# Altium schematic symbol library LATTICEPLDS_Library.SchLib: 291 symbols (part 9 of 32) (continued)
## LFE2-70-F900 (continued)
part G pins: AA10 PB7B, AA12 VCCIO5 (power), AA13 VCCIO5 (power), AA14 VCCIO5 (power), AB10 PB7A, AB12 VCCIO5 (power), AB13 VCCIO5 (power), AB14 VCCIO5 (power), AB15 PB47A, AC8 PB2A, AC9 PB5A, AC10 PB9A, AC11 PB30A, AC12 PB35A, AC13 PB39B, AC14 PB42B, AD8 PB3A, AD9 PB6A, AD10 PB29A, AD11 PB30B, AD12 PB36A, AD13 PB40B, AD14 PB42A, AD15 PB47B, AD16 PB52A, AE8 PB2B, AE9 PB5B, AE10 PB9B, AE11 PB32A, AE12 PB35B, AE13 PB39A, AE14 PB43B, AE15 PB48A, AF6 PB11A, AF7 PB11B, AF8 PB3B, AF9 PB6B, AF10 PB29B, AF11 PB34A, AF12 PB36B, AF13 PB40A, AF14 PB45B, AF15 PB48B, AF16 PB52B, AG5 PB12A, AG6 PB13A, AG7 PB4A, AG9 PB31A, AG10 PB32B, AG11 PB38A, AG12 PB43A, AG14 PB49B, AG15 PB49A, AH5 PB12B, AH6 PB13B, AH7 PB4B, AH9 PB31B, AH10 PB34B, AH11 PB38B, AH12 PB45A, AH14 PB50B, AH15 PB50A, AJ4 PB14A, AJ5 PB15A, AJ6 PB16A, AJ7 PB8A, AJ8 PB10A, AJ9 PB33A, AJ10 PB37A, AJ11 PB41A, AJ12 PB44A, AJ13 PB46A, AJ14 PB51A, AJ15 PB53A, AK4 PB14B, AK5 PB15B, AK6 PB16B, AK7 PB8B, AK8 PB10B, AK9 PB33B, AK10 PB37B, AK11 PB41B, AK12 PB44B, AK13 PB46B, AK14 PB51B, AK15 PB53B
part H pins: AA1 PL80B, AA2 PL80A, AA3 PL82B, AA4 PL82A, AA5 PL81B, AA6 PL79A, AA7 PL81A, AA8 PL79B, AB1 PL84B, AB2 PL84A, AB3 PL86B, AB4 PL86A, AB5 PL83B, AB6 PL85B, AB7 PL83A, AB8 PL85A, AB9 PL91B, AC1 PL88B, AC2 PL88A, AC5 PL87B, AC6 PL89A, AC7 PL87A, AD1 PL90A, AD2 PL90B, AD6 PL89B, AD7 PL91A, R3 PL59B, R4 PL59A, T1 PL63B, T2 PL63A, T3 PL61A, T4 PL61B, T5 PL60A, T6 PL62A, T7 PL60B, T8 PL62B, U1 PL67B, U2 PL67A, U3 PL65B, U4 PL65A, U5 PL64B, U6 PL66B, U7 PL64A, U8 PL66A, U9 VCCIO6 (power), U10 VCCIO6 (power), V1 PL69B, V2 PL69A, V5 PL68B, V6 PL70B, V7 PL68A, V8 PL70A, V10 VCCIO6 (power), W1 PL71A, W2 PL71B, W3 PL73B, W4 PL73A, W5 PL72A, W6 PL74A, W7 PL72B, W8 PL74B, W9 VCCIO6 (power), W10 VCCIO6 (power), Y1 PL76A, Y2 PL76B, Y3 PL78B, Y4 PL78A, Y5 PL77A, Y6 PL77B, Y8 LLM0_PLLCAP, Y9 VCCIO6 (power)
part I pins: D1 PL4B, D2 PL4A, E1 PL5B, E2 PL5A, F1 PL14A, F2 PL14B, F3 PL2B, F4 PL2A, G1 PL15A, G2 PL15B, G3 PL19B, G4 PL19A, G5 PL3B, H1 PL21B, H2 PL21A, H4 PL3A, H5 PL20B, H6 PL18B, H7 PL20A, H8 PL18A, J1 PL23B, J2 PL23A, J3 PL25B, J4 PL25A, J5 PL24A, J6 PL22A, J7 PL24B, J8 PL22B, K1 PL27B, K2 PL27A, K3 PL29B, K4 PL29A, K5 PL28A, K6 PL26A, K7 PL28B, K8 PL26B, L1 PL31B, L2 PL31A, L3 PL33B, L4 PL33A, L5 PL32B, L6 PL30B, L7 PL32A, L8 PL30A, L9 VCCIO7 (power), L10 VCCIO7 (power), M1 PL35B, M2 PL35A, M3 PL37B, M4 PL37A, M5 PL36B, M6 PL34B, M7 PL36A, M8 PL34A, M10 VCCIO7 (power), N1 PL52B, N2 PL52A, N5 PL39A, N6 PL38A, N7 PL39B, N8 PL38B, N10 VCCIO7 (power), P1 PL56B, P2 PL56A, P3 PL54B, P4 PL54A, P5 PL53B, P6 PL53A, P7 PL51B, P10 VCCIO7 (power), R5 PL57A, R6 PL55A, R7 PL57B, R8 PL55B, R9 PL51A, R10 VCCIO7 (power), T9 PL50A
part J pins: AA21 VCCIO8 (power), AA22 PROGRAMN, AB22 CFG1, AB23 PR87A, AB24 PR87B, AB25 PR86B, AB26 PR86A, AB27 PR85A, AC24 DONE, AC25 PR90B, AC26 PR89B, AC27 PR85B, AD25 CCLK, AD26 INITN, AD27 PR88B, AD28 PR88A, AD29 PR84B, AD30 PR84A, AE25 CFG2, AE26 CFG0, AE27 PR90A, AE28 PR89A, Y21 VCCIO8 (power)
part K pins: AA9 TDO, AD3 VCCJ (power), AD4 TMS, AD5 TCK, AE7 TDI
part B text: BANK 0
part C text: BANK 1
part D text: BANK 2
part E text: BANK 3
part F text: BANK 4
part G text: BANK 5
part H text: BANK 6
part I text: BANK 7
part J text: BANK 8
part K text: JTAG

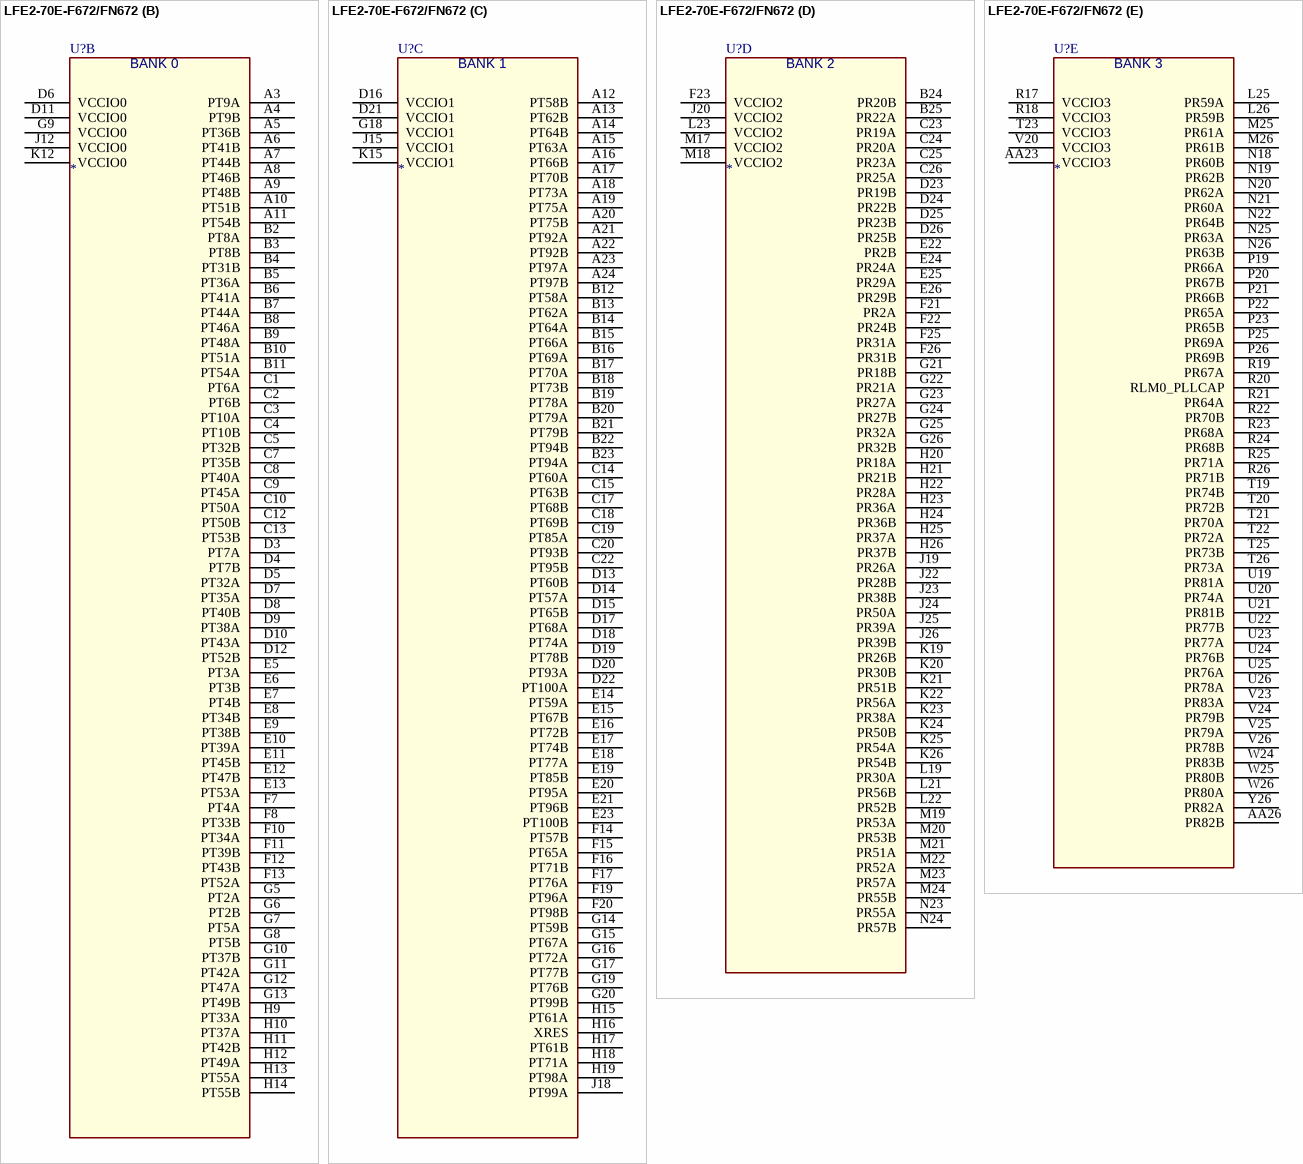
[diagram p93: symbol LFE2-70E-F672/FN672]

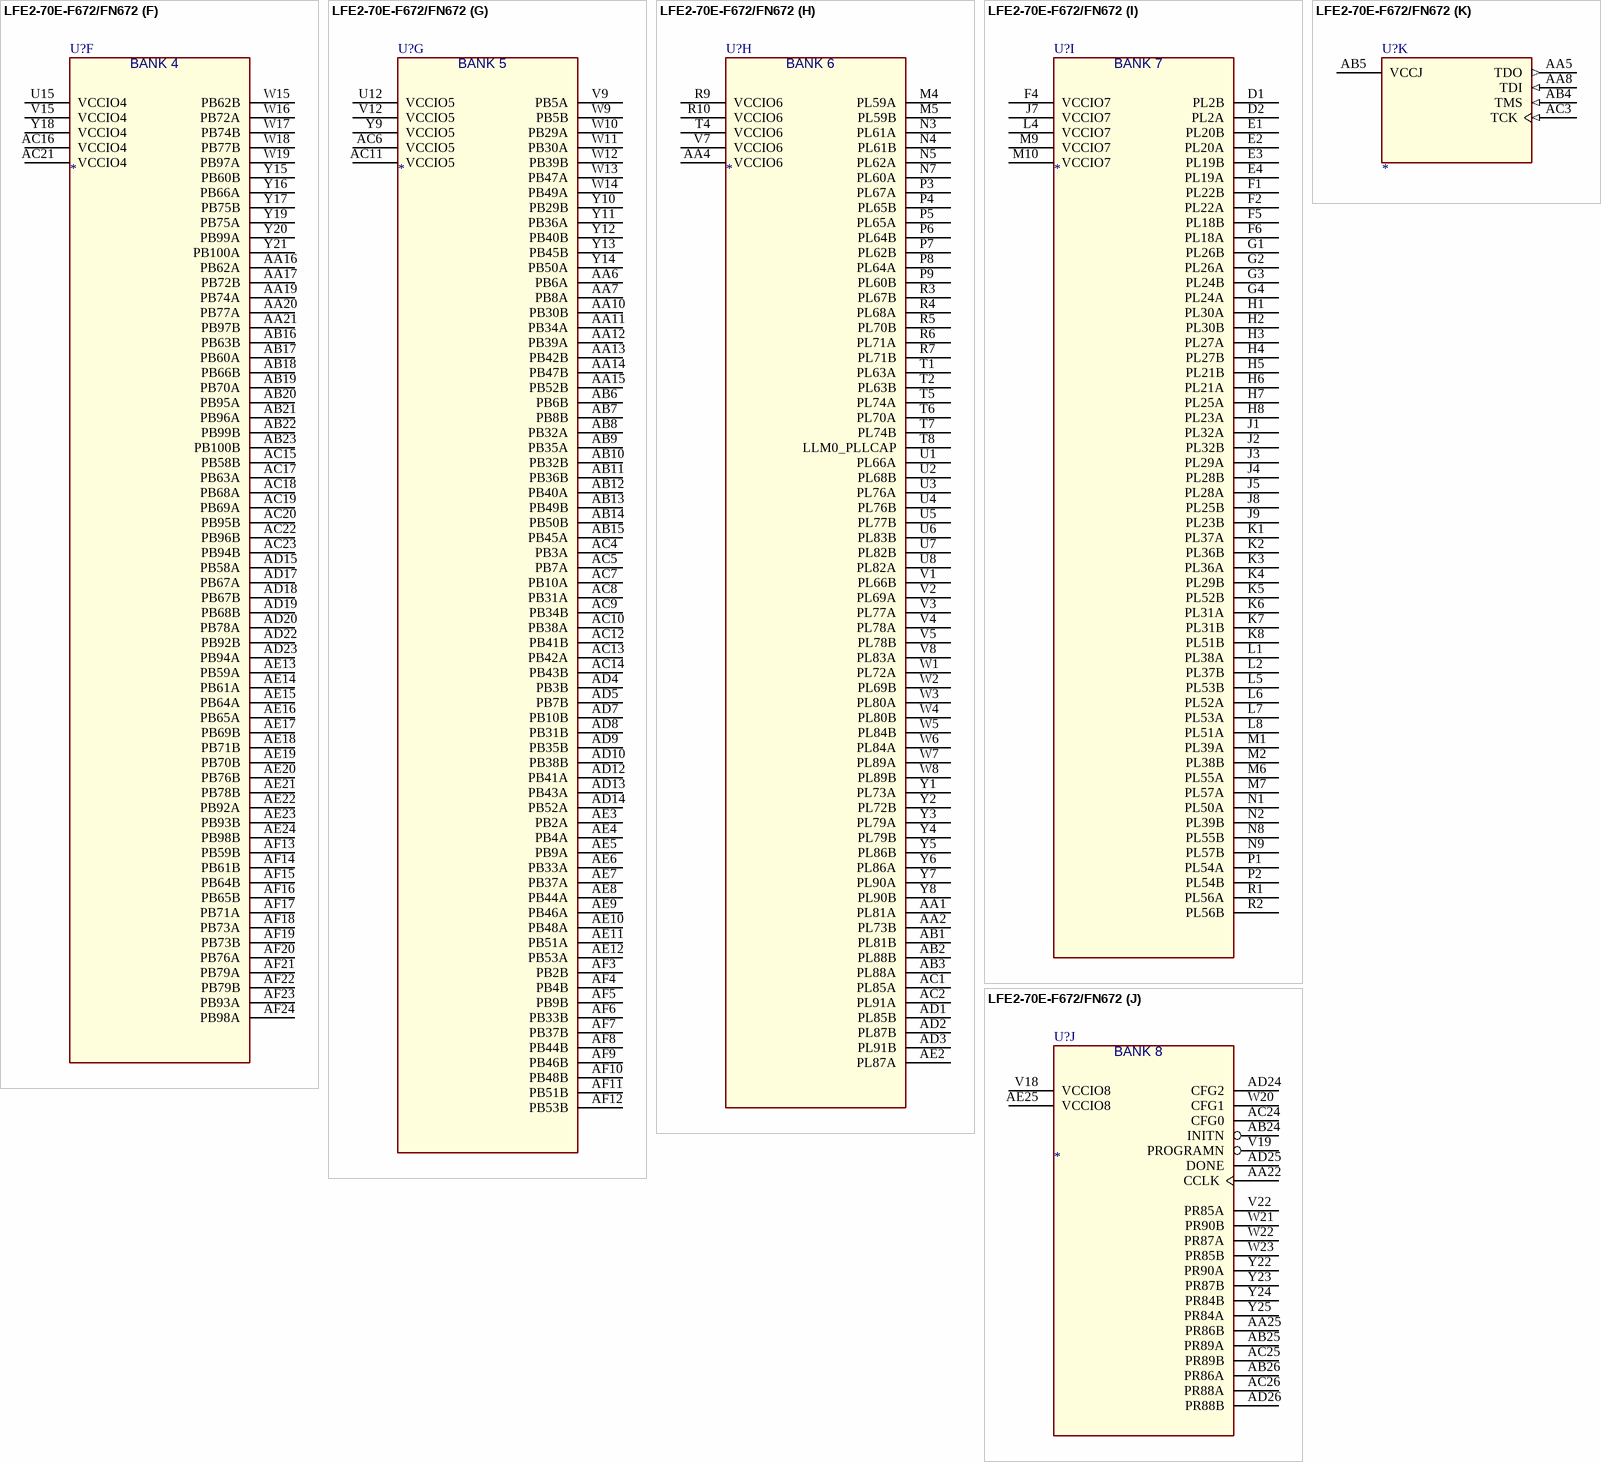
[diagram p94: symbol LFE2-70E-F672/FN672]

## LFE2-70E-F672/FN672
designator U?
SPLIT_INST: TRUE; SWAP_INFO: (S1+S2+S3+S4+S5+S6+S7+S8+S9+S10+S11)
part A pins: A2 GND (power), A25 GND (power), AA3 GND (power), AA9 GND (power), AA18 GND (power), AA24 GND (power), AD6 GND (power), AD11 GND (power), AD16 GND (power), AD21 GND (power), AE1 GND (power), AE26 GND (power), AF2 GND (power), AF25 GND (power), B1 GND (power), B26 GND (power), C6 GND (power), C11 GND (power), C16 GND (power), C21 GND (power), F3 GND (power), F9 GND (power), F18 GND (power), F24 GND (power), J6 GND (power), J10 VCCAUX (power), J11 VCCAUX (power), J13 GND (power), J14 GND (power), J16 VCCAUX (power), J17 VCCAUX (power), J21 GND (power), K9 VCCAUX (power), K10 GND (power), K11 GND (power), K13 GND (power), K14 GND (power), K16 GND (power), K17 GND (power), K18 VCCAUX (power), L3 GND (power), L9 VCCAUX (power), L10 GND (power), L11 GND (power), L12 VCC (power), L13 VCC (power), L14 VCC (power), L15 VCC (power), L16 GND (power), L17 GND (power), L18 VCCAUX (power), L20 NC, L24 GND (power), M3 NC, M8 NC, M11 VCC (power), M12 VCC (power), M13 GND (power), M14 GND (power), M15 VCC (power), M16 VCC (power), N6 NC, N10 GND (power), N11 VCC (power), N12 GND (power), N13 GND (power), N14 GND (power), N15 GND (power), N16 VCC (power), N17 GND (power), P10 GND (power), P11 VCC (power), P12 GND (power), P13 GND (power), P14 GND (power), P15 GND (power), P16 VCC (power), P17 GND (power), P18 VCCPLL (power), P24 NC, R8 VCCPLL (power), R11 VCC (power), R12 VCC (power), R13 GND (power), R14 GND (power), R15 VCC (power), R16 VCC (power), T3 GND (power), T9 VCCAUX (power), T10 GND (power), T11 GND (power), T12 VCC (power), T13 VCC (power), T14 VCC (power), T15 VCC (power), T16 GND (power), T17 GND (power), T18 VCCAUX (power), T24 GND (power), U9 VCCAUX (power), U10 GND (power), U11 GND (power), U13 GND (power), U14 GND (power), U16 GND (power), U17 GND (power), U18 VCCAUX (power), V6 GND (power), V10 VCCAUX (power), V11 VCCAUX (power), V13 GND (power), V14 GND (power), V16 VCCAUX (power), V17 VCCAUX (power), V21 GND (power)
part B pins: A3 PT9A, A4 PT9B, A5 PT36B, A6 PT41B, A7 PT44B, A8 PT46B, A9 PT48B, A10 PT51B, A11 PT54B, B2 PT8A, B3 PT8B, B4 PT31B, B5 PT36A, B6 PT41A, B7 PT44A, B8 PT46A, B9 PT48A, B10 PT51A, B11 PT54A, C1 PT6A, C2 PT6B, C3 PT10A, C4 PT10B, C5 PT32B, C7 PT35B, C8 PT40A, C9 PT45A, C10 PT50A, C12 PT50B, C13 PT53B, D3 PT7A, D4 PT7B, D5 PT32A, D6 VCCIO0 (power), D7 PT35A, D8 PT40B, D9 PT38A, D10 PT43A, D11 VCCIO0 (power), D12 PT52B, E5 PT3A, E6 PT3B, E7 PT4B, E8 PT34B, E9 PT38B, E10 PT39A, E11 PT45B, E12 PT47B, E13 PT53A, F7 PT4A, F8 PT33B, F10 PT34A, F11 PT39B, F12 PT43B, F13 PT52A, G5 PT2A, G6 PT2B, G7 PT5A, G8 PT5B, G9 VCCIO0 (power), G10 PT37B, G11 PT42A, G12 PT47A, G13 PT49B, H9 PT33A, H10 PT37A, H11 PT42B, H12 PT49A, H13 PT55A, H14 PT55B, J12 VCCIO0 (power), K12 VCCIO0 (power)
part C pins: A12 PT58B, A13 PT62B, A14 PT64B, A15 PT63A, A16 PT66B, A17 PT70B, A18 PT73A, A19 PT75A, A20 PT75B, A21 PT92A, A22 PT92B, A23 PT97A, A24 PT97B, B12 PT58A, B13 PT62A, B14 PT64A, B15 PT66A, B16 PT69A, B17 PT70A, B18 PT73B, B19 PT78A, B20 PT79A, B21 PT79B, B22 PT94B, B23 PT94A, C14 PT60A, C15 PT63B, C17 PT68B, C18 PT69B, C19 PT85A, C20 PT93B, C22 PT95B, D13 PT60B, D14 PT57A, D15 PT65B, D16 VCCIO1 (power), D17 PT68A, D18 PT74A, D19 PT78B, D20 PT93A, D21 VCCIO1 (power), D22 PT100A, E14 PT59A, E15 PT67B, E16 PT72B, E17 PT74B, E18 PT77A, E19 PT85B, E20 PT95A, E21 PT96B, E23 PT100B, F14 PT57B, F15 PT65A, F16 PT71B, F17 PT76A, F19 PT96A, F20 PT98B, G14 PT59B, G15 PT67A, G16 PT72A, G17 PT77B, G18 VCCIO1 (power), G19 PT76B, G20 PT99B, H15 PT61A, H16 XRES, H17 PT61B, H18 PT71A, H19 PT98A, J15 VCCIO1 (power), J18 PT99A, K15 VCCIO1 (power)
part D pins: B24 PR20B, B25 PR22A, C23 PR19A, C24 PR20A, C25 PR23A, C26 PR25A, D23 PR19B, D24 PR22B, D25 PR23B, D26 PR25B, E22 PR2B, E24 PR24A, E25 PR29A, E26 PR29B, F21 PR2A, F22 PR24B, F23 VCCIO2 (power), F25 PR31A, F26 PR31B, G21 PR18B, G22 PR21A, G23 PR27A, G24 PR27B, G25 PR32A, G26 PR32B, H20 PR18A, H21 PR21B, H22 PR28A, H23 PR36A, H24 PR36B, H25 PR37A, H26 PR37B, J19 PR26A, J20 VCCIO2 (power), J22 PR28B, J23 PR38B, J24 PR50A, J25 PR39A, J26 PR39B, K19 PR26B, K20 PR30B, K21 PR51B, K22 PR56A, K23 PR38A, K24 PR50B, K25 PR54A, K26 PR54B, L19 PR30A, L21 PR56B, L22 PR52B, L23 VCCIO2 (power), M17 VCCIO2 (power), M18 VCCIO2 (power), M19 PR53A, M20 PR53B, M21 PR51A, M22 PR52A, M23 PR57A, M24 PR55B, N23 PR55A, N24 PR57B
part E pins: AA23 VCCIO3 (power), AA26 PR82B, L25 PR59A, L26 PR59B, M25 PR61A, M26 PR61B, N18 PR60B, N19 PR62B, N20 PR62A, N21 PR60A, N22 PR64B, N25 PR63A, N26 PR63B, P19 PR66A, P20 PR67B, P21 PR66B, P22 PR65A, P23 PR65B, P25 PR69A, P26 PR69B, R17 VCCIO3 (power), R18 VCCIO3 (power), R19 PR67A, R20 RLM0_PLLCAP, R21 PR64A, R22 PR70B, R23 PR68A, R24 PR68B, R25 PR71A, R26 PR71B, T19 PR74B, T20 PR72B, T21 PR70A, T22 PR72A, T23 VCCIO3 (power), T25 PR73B, T26 PR73A, U19 PR81A, U20 PR74A, U21 PR81B, U22 PR77B, U23 PR77A, U24 PR76B, U25 PR76A, U26 PR78A, V20 VCCIO3 (power), V23 PR83A, V24 PR79B, V25 PR79A, V26 PR78B, W24 PR83B, W25 PR80B, W26 PR80A, Y26 PR82A
part F pins: AA16 PB62A, AA17 PB72B, AA19 PB74A, AA20 PB77A, AA21 PB97B, AB16 PB63B, AB17 PB60A, AB18 PB66B, AB19 PB70A, AB20 PB95A, AB21 PB96A, AB22 PB99B, AB23 PB100B, AC15 PB58B, AC16 VCCIO4 (power), AC17 PB63A, AC18 PB68A, AC19 PB69A, AC20 PB95B, AC21 VCCIO4 (power), AC22 PB96B, AC23 PB94B, AD15 PB58A, AD17 PB67A, AD18 PB67B, AD19 PB68B, AD20 PB78A, AD22 PB92B, AD23 PB94A, AE13 PB59A, AE14 PB61A, AE15 PB64A, AE16 PB65A, AE17 PB69B, AE18 PB71B, AE19 PB70B, AE20 PB76B, AE21 PB78B, AE22 PB92A, AE23 PB93B, AE24 PB98B, AF13 PB59B, AF14 PB61B, AF15 PB64B, AF16 PB65B, AF17 PB71A, AF18 PB73A, AF19 PB73B, AF20 PB76A, AF21 PB79A, AF22 PB79B, AF23 PB93A, AF24 PB98A, U15 VCCIO4 (power), V15 VCCIO4 (power), W15 PB62B, W16 PB72A, W17 PB74B, W18 PB77B, W19 PB97A, Y15 PB60B, Y16 PB66A, Y17 PB75B, Y18 VCCIO4 (power), Y19 PB75A, Y20 PB99A, Y21 PB100A
part G pins: AA6 PB6A, AA7 PB8A, AA10 PB30B, AA11 PB34A, AA12 PB39A, AA13 PB42B, AA14 PB47B, AA15 PB52B, AB6 PB6B, AB7 PB8B, AB8 PB32A, AB9 PB35A, AB10 PB32B, AB11 PB36B, AB12 PB40A, AB13 PB49B, AB14 PB50B, AB15 PB45A, AC4 PB3A, AC5 PB7A, AC6 VCCIO5 (power), AC7 PB10A, AC8 PB31A, AC9 PB34B, AC10 PB38A, AC11 VCCIO5 (power), AC12 PB41B, AC13 PB42A, AC14 PB43B, AD4 PB3B, AD5 PB7B, AD7 PB10B, AD8 PB31B, AD9 PB35B, AD10 PB38B, AD12 PB41A, AD13 PB43A, AD14 PB52A, AE3 PB2A, AE4 PB4A, AE5 PB9A, AE6 PB33A, AE7 PB37A, AE8 PB44A, AE9 PB46A, AE10 PB48A, AE11 PB51A, AE12 PB53A, AF3 PB2B, AF4 PB4B, AF5 PB9B, AF6 PB33B, AF7 PB37B, AF8 PB44B, AF9 PB46B, AF10 PB48B, AF11 PB51B, AF12 PB53B, U12 VCCIO5 (power), V9 PB5A, V12 VCCIO5 (power), W9 PB5B, W10 PB29A, W11 PB30A, W12 PB39B, W13 PB47A, W14 PB49A, Y9 VCCIO5 (power), Y10 PB29B, Y11 PB36A, Y12 PB40B, Y13 PB45B, Y14 PB50A
part H pins: AA1 PL81A, AA2 PL73B, AA4 VCCIO6 (power), AB1 PL81B, AB2 PL88B, AB3 PL88A, AC1 PL85A, AC2 PL91A, AD1 PL85B, AD2 PL87B, AD3 PL91B, AE2 PL87A, M4 PL59A, M5 PL59B, N3 PL61A, N4 PL61B, N5 PL62A, N7 PL60A, P3 PL67A, P4 PL65B, P5 PL65A, P6 PL64B, P7 PL62B, P8 PL64A, P9 PL60B, R3 PL67B, R4 PL68A, R5 PL70B, R6 PL71A, R7 PL71B, R9 VCCIO6 (power), R10 VCCIO6 (power), T1 PL63A, T2 PL63B, T4 VCCIO6 (power), T5 PL74A, T6 PL70A, T7 PL74B, T8 LLM0_PLLCAP, U1 PL66A, U2 PL68B, U3 PL76A, U4 PL76B, U5 PL77B, U6 PL83B, U7 PL82B, U8 PL82A, V1 PL66B, V2 PL69A, V3 PL77A, V4 PL78A, V5 PL78B, V7 VCCIO6 (power), V8 PL83A, W1 PL72A, W2 PL69B, W3 PL80A, W4 PL80B, W5 PL84B, W6 PL84A, W7 PL89A, W8 PL89B, Y1 PL73A, Y2 PL72B, Y3 PL79A, Y4 PL79B, Y5 PL86B, Y6 PL86A, Y7 PL90A, Y8 PL90B
part I pins: D1 PL2B, D2 PL2A, E1 PL20B, E2 PL20A, E3 PL19B, E4 PL19A, F1 PL22B, F2 PL22A, F4 VCCIO7 (power), F5 PL18B, F6 PL18A, G1 PL26B, G2 PL26A, G3 PL24B, G4 PL24A, H1 PL30A, H2 PL30B, H3 PL27A, H4 PL27B, H5 PL21B, H6 PL21A, H7 PL25A, H8 PL23A, J1 PL32A, J2 PL32B, J3 PL29A, J4 PL28B, J5 PL28A, J7 VCCIO7 (power), J8 PL25B, J9 PL23B, K1 PL37A, K2 PL36B, K3 PL36A, K4 PL29B, K5 PL52B, K6 PL31A, K7 PL31B, K8 PL51B, L1 PL38A, L2 PL37B, L4 VCCIO7 (power), L5 PL53B, L6 PL52A, L7 PL53A, L8 PL51A, M1 PL39A, M2 PL38B, M6 PL55A, M7 PL57A, M9 VCCIO7 (power), M10 VCCIO7 (power), N1 PL50A, N2 PL39B, N8 PL55B, N9 PL57B, P1 PL54A, P2 PL54B, R1 PL56A, R2 PL56B
part J pins: AA22 CCLK, AA25 PR86B, AB24 INITN, AB25 PR89A, AB26 PR86A, AC24 CFG0, AC25 PR89B, AC26 PR88A, AD24 CFG2, AD25 DONE, AD26 PR88B, AE25 VCCIO8 (power), V18 VCCIO8 (power), V19 PROGRAMN, V22 PR85A, W20 CFG1, W21 PR90B, W22 PR87A, W23 PR85B, Y22 PR90A, Y23 PR87B, Y24 PR84B, Y25 PR84A
part K pins: AA5 TDO (out), AA8 TDI (in), AB4 TMS (in), AB5 VCCJ (power), AC3 TCK (in)
part A text: SUPPLIES
part B text: BANK 0
part C text: BANK 1
part D text: BANK 2
part E text: BANK 3
part F text: BANK 4
part G text: BANK 5
part H text: BANK 6
part I text: BANK 7
part J text: BANK 8

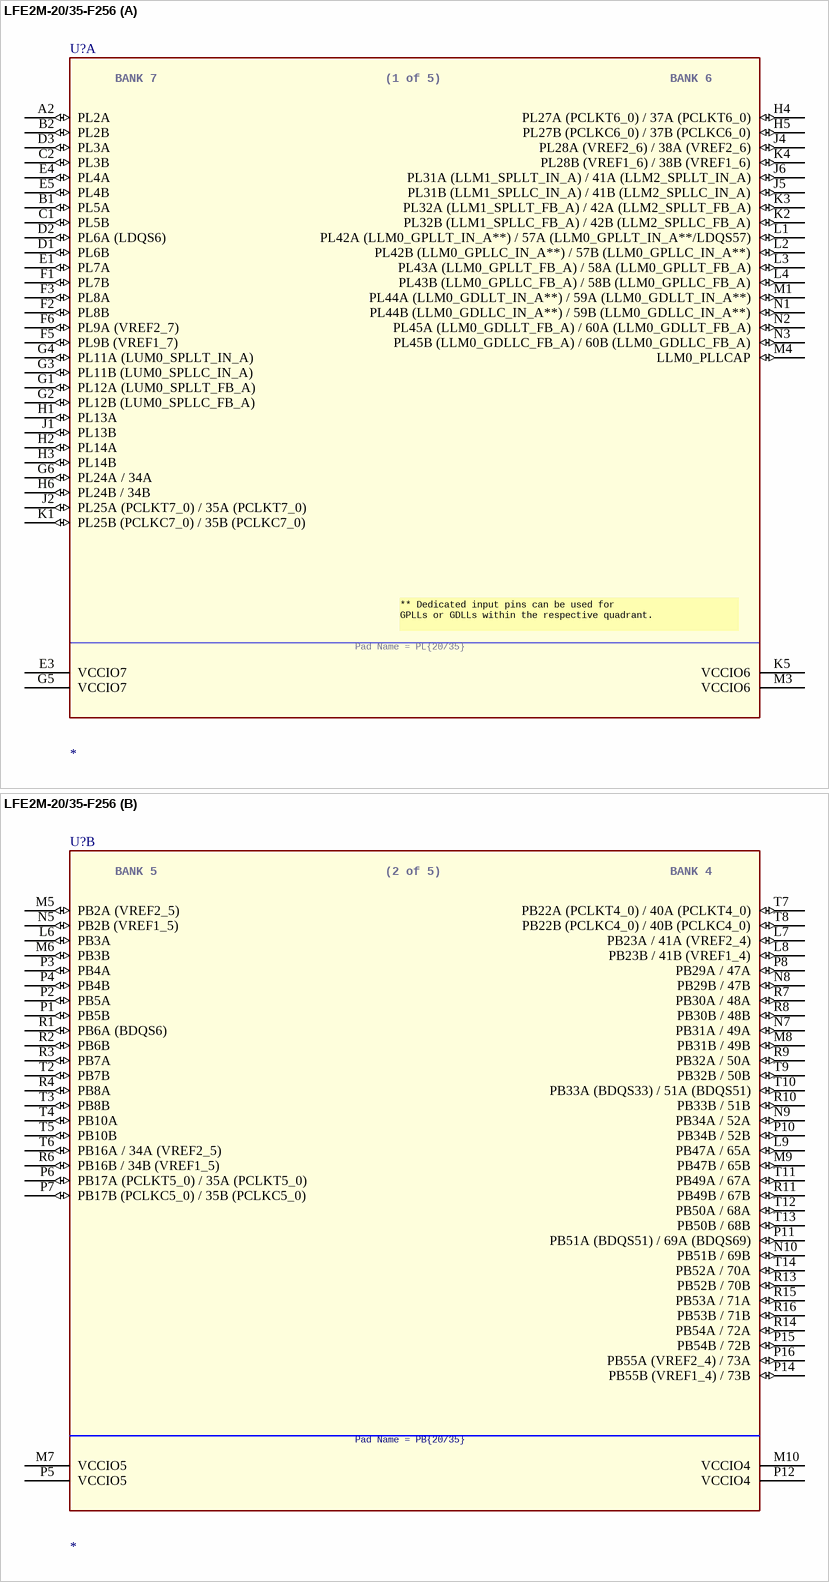
[diagram p95: symbol LFE2M-20/35-F256]

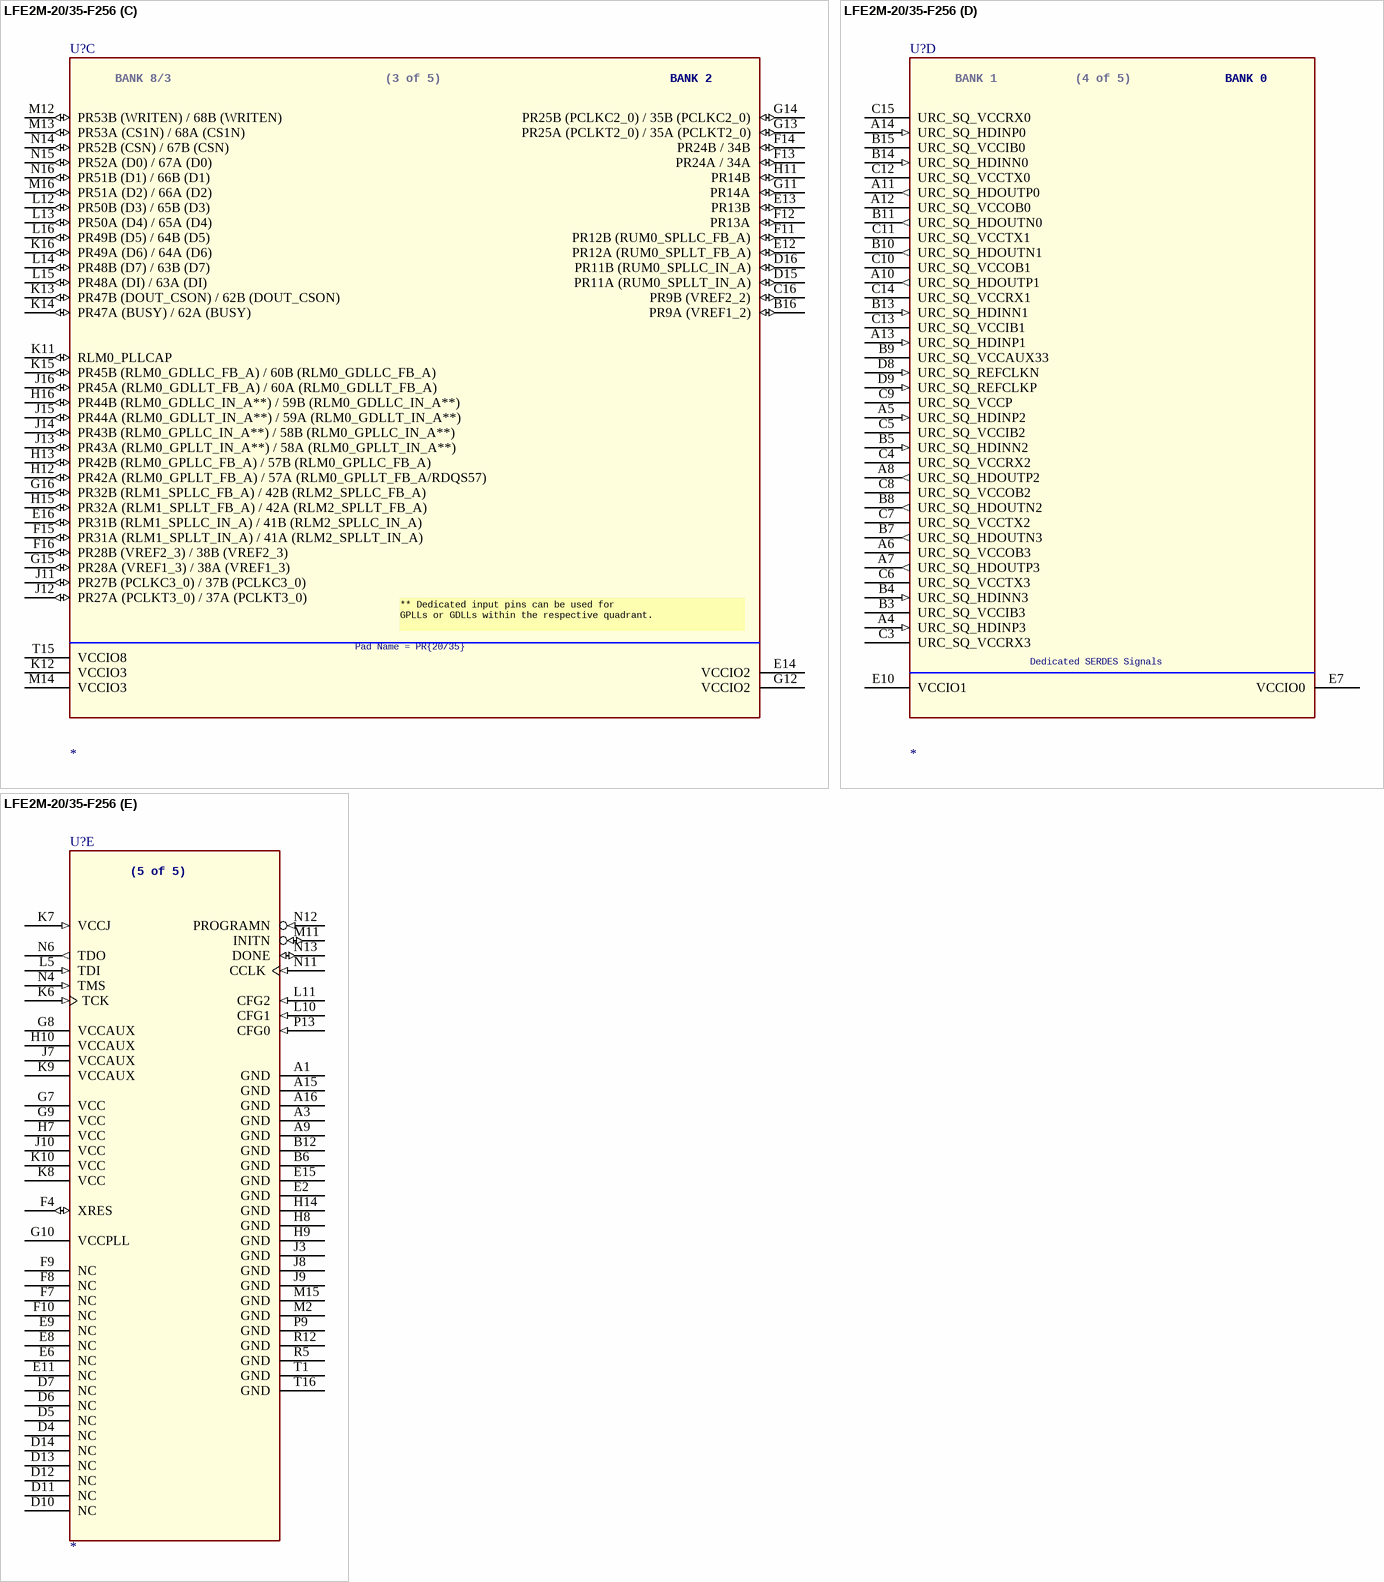
[diagram p96: symbol LFE2M-20/35-F256]

## LFE2M-20/35-F256
designator U?
SPLIT_INST: TRUE; SWAP_INFO: (S1+S2+S3+S4+S5)
part A pins: A2 PL2A (io), B1 PL5A (io), B2 PL2B (io), C1 PL5B (io), C2 PL3B (io), D1 PL6B (io), D2 PL6A (LDQS6) (io), D3 PL3A (io), E1 PL7A (io), E3 VCCIO7 (power), E4 PL4A (io), E5 PL4B (io), F1 PL7B (io), F2 PL8B (io), F3 PL8A (io), F5 PL9B (VREF1_7) (io), F6 PL9A (VREF2_7) (io), G1 PL12A (LUM0_SPLLT_FB_A) (io), G2 PL12B (LUM0_SPLLC_FB_A) (io), G3 PL11B (LUM0_SPLLC_IN_A) (io), G4 PL11A (LUM0_SPLLT_IN_A) (io), G5 VCCIO7 (power), G6 PL24A / 34A (io), H1 PL13A (io), H2 PL14A (io), H3 PL14B (io), H4 PL27A (PCLKT6_0) / 37A (PCLKT6_0) (io), H5 PL27B (PCLKC6_0) / 37B (PCLKC6_0) (io), H6 PL24B / 34B (io), J1 PL13B (io), J2 PL25A (PCLKT7_0) / 35A (PCLKT7_0) (io), J4 PL28A (VREF2_6) / 38A (VREF2_6) (io), J5 PL31B (LLM1_SPLLC_IN_A) / 41B (LLM2_SPLLC_IN_A) (io), J6 PL31A (LLM1_SPLLT_IN_A) / 41A (LLM2_SPLLT_IN_A) (io), K1 PL25B (PCLKC7_0) / 35B (PCLKC7_0) (io), K2 PL32B (LLM1_SPLLC_FB_A) / 42B (LLM2_SPLLC_FB_A) (io), K3 PL32A (LLM1_SPLLT_FB_A) / 42A (LLM2_SPLLT_FB_A) (io), K4 PL28B (VREF1_6) / 38B (VREF1_6) (io), K5 VCCIO6 (power), L1 PL42A (LLM0_GPLLT_IN_A**) / 57A (LLM0_GPLLT_IN_A**/LDQS57) (io), L2 PL42B (LLM0_GPLLC_IN_A**) / 57B (LLM0_GPLLC_IN_A**) (io), L3 PL43A (LLM0_GPLLT_FB_A) / 58A (LLM0_GPLLT_FB_A) (io), L4 PL43B (LLM0_GPLLC_FB_A) / 58B (LLM0_GPLLC_FB_A) (io), M1 PL44A (LLM0_GDLLT_IN_A**) / 59A (LLM0_GDLLT_IN_A**) (io), M3 VCCIO6 (power), M4 LLM0_PLLCAP (io), N1 PL44B (LLM0_GDLLC_IN_A**) / 59B (LLM0_GDLLC_IN_A**) (io), N2 PL45A (LLM0_GDLLT_FB_A) / 60A (LLM0_GDLLT_FB_A) (io), N3 PL45B (LLM0_GDLLC_FB_A) / 60B (LLM0_GDLLC_FB_A) (io)
part B pins: L6 PB3A (io), L7 PB23A / 41A (VREF2_4) (io), L8 PB23B / 41B (VREF1_4) (io), L9 PB47A / 65A (io), M5 PB2A (VREF2_5) (io), M6 PB3B (io), M7 VCCIO5 (power), M8 PB31B / 49B (io), M9 PB47B / 65B (io), M10 VCCIO4 (power), N5 PB2B (VREF1_5) (io), N7 PB31A / 49A (io), N8 PB29B / 47B (io), N9 PB34A / 52A (io), N10 PB51B / 69B (io), P1 PB5B (io), P2 PB5A (io), P3 PB4A (io), P4 PB4B (io), P5 VCCIO5 (power), P6 PB17A (PCLKT5_0) / 35A (PCLKT5_0) (io), P7 PB17B (PCLKC5_0) / 35B (PCLKC5_0) (io), P8 PB29A / 47A (io), P10 PB34B / 52B (io), P11 PB51A (BDQS51) / 69A (BDQS69) (io), P12 VCCIO4 (power), P14 PB55B (VREF1_4) / 73B (io), P15 PB54B / 72B (io), P16 PB55A (VREF2_4) / 73A (io), R1 PB6A (BDQS6) (io), R2 PB6B (io), R3 PB7A (io), R4 PB8A (io), R6 PB16B / 34B (VREF1_5) (io), R7 PB30A / 48A (io), R8 PB30B / 48B (io), R9 PB32A / 50A (io), R10 PB33B / 51B (io), R11 PB49B / 67B (io), R13 PB52B / 70B (io), R14 PB54A / 72A (io), R15 PB53A / 71A (io), R16 PB53B / 71B (io), T2 PB7B (io), T3 PB8B (io), T4 PB10A (io), T5 PB10B (io), T6 PB16A / 34A (VREF2_5) (io), T7 PB22A (PCLKT4_0) / 40A (PCLKT4_0) (io), T8 PB22B (PCLKC4_0) / 40B (PCLKC4_0) (io), T9 PB32B / 50B (io), T10 PB33A (BDQS33) / 51A (BDQS51) (io), T11 PB49A / 67A (io), T12 PB50A / 68A (io), T13 PB50B / 68B (io), T14 PB52A / 70A (io)
part C pins: B16 PR9A (VREF1_2) (io), C16 PR9B (VREF2_2) (io), D15 PR11A (RUM0_SPLLT_IN_A) (io), D16 PR11B (RUM0_SPLLC_IN_A) (io), E12 PR12A (RUM0_SPLLT_FB_A) (io), E13 PR13B (io), E14 VCCIO2 (power), E16 PR31B (RLM1_SPLLC_IN_A) / 41B (RLM2_SPLLC_IN_A) (io), F11 PR12B (RUM0_SPLLC_FB_A) (io), F12 PR13A (io), F13 PR24A / 34A (io), F14 PR24B / 34B (io), F15 PR31A (RLM1_SPLLT_IN_A) / 41A (RLM2_SPLLT_IN_A) (io), F16 PR28B (VREF2_3) / 38B (VREF2_3) (io), G11 PR14A (io), G12 VCCIO2 (power), G13 PR25A (PCLKT2_0) / 35A (PCLKT2_0) (io), G14 PR25B (PCLKC2_0) / 35B (PCLKC2_0) (io), G15 PR28A (VREF1_3) / 38A (VREF1_3) (io), G16 PR32B (RLM1_SPLLC_FB_A) / 42B (RLM2_SPLLC_FB_A) (io), H11 PR14B (io), H12 PR42A (RLM0_GPLLT_FB_A) / 57A (RLM0_GPLLT_FB_A/RDQS57) (io), H13 PR42B (RLM0_GPLLC_FB_A) / 57B (RLM0_GPLLC_FB_A) (io), H15 PR32A (RLM1_SPLLT_FB_A) / 42A (RLM2_SPLLT_FB_A) (io), H16 PR44B (RLM0_GDLLC_IN_A**) / 59B (RLM0_GDLLC_IN_A**) (io), J11 PR27B (PCLKC3_0) / 37B (PCLKC3_0) (io), J12 PR27A (PCLKT3_0) / 37A (PCLKT3_0) (io), J13 PR43A (RLM0_GPLLT_IN_A**) / 58A (RLM0_GPLLT_IN_A**) (io), J14 PR43B (RLM0_GPLLC_IN_A**) / 58B (RLM0_GPLLC_IN_A**) (io), J15 PR44A (RLM0_GDLLT_IN_A**) / 59A (RLM0_GDLLT_IN_A**) (io), J16 PR45A (RLM0_GDLLT_FB_A) / 60A (RLM0_GDLLT_FB_A) (io), K11 RLM0_PLLCAP (io), K12 VCCIO3 (power), K13 PR47B (DOUT_CSON) / 62B (DOUT_CSON) (io), K14 PR47A (BUSY) / 62A (BUSY) (io), K15 PR45B (RLM0_GDLLC_FB_A) / 60B (RLM0_GDLLC_FB_A) (io), K16 PR49A (D6) / 64A (D6) (io), L12 PR50B (D3) / 65B (D3) (io), L13 PR50A (D4) / 65A (D4) (io), L14 PR48B (D7) / 63B (D7) (io), L15 PR48A (DI) / 63A (DI) (io), L16 PR49B (D5) / 64B (D5) (io), M12 PR53B (WRITEN) / 68B (WRITEN) (io), M13 PR53A (CS1N) / 68A (CS1N) (io), M14 VCCIO3 (power), M16 PR51A (D2) / 66A (D2) (io), N14 PR52B (CSN) / 67B (CSN) (io), N15 PR52A (D0) / 67A (D0) (io), N16 PR51B (D1) / 66B (D1) (io), T15 VCCIO8 (power)